# Altium integrated library Relay.IntLib: 29 symbols
Pins are listed as number, name and electrical type; pins without a type are passive.

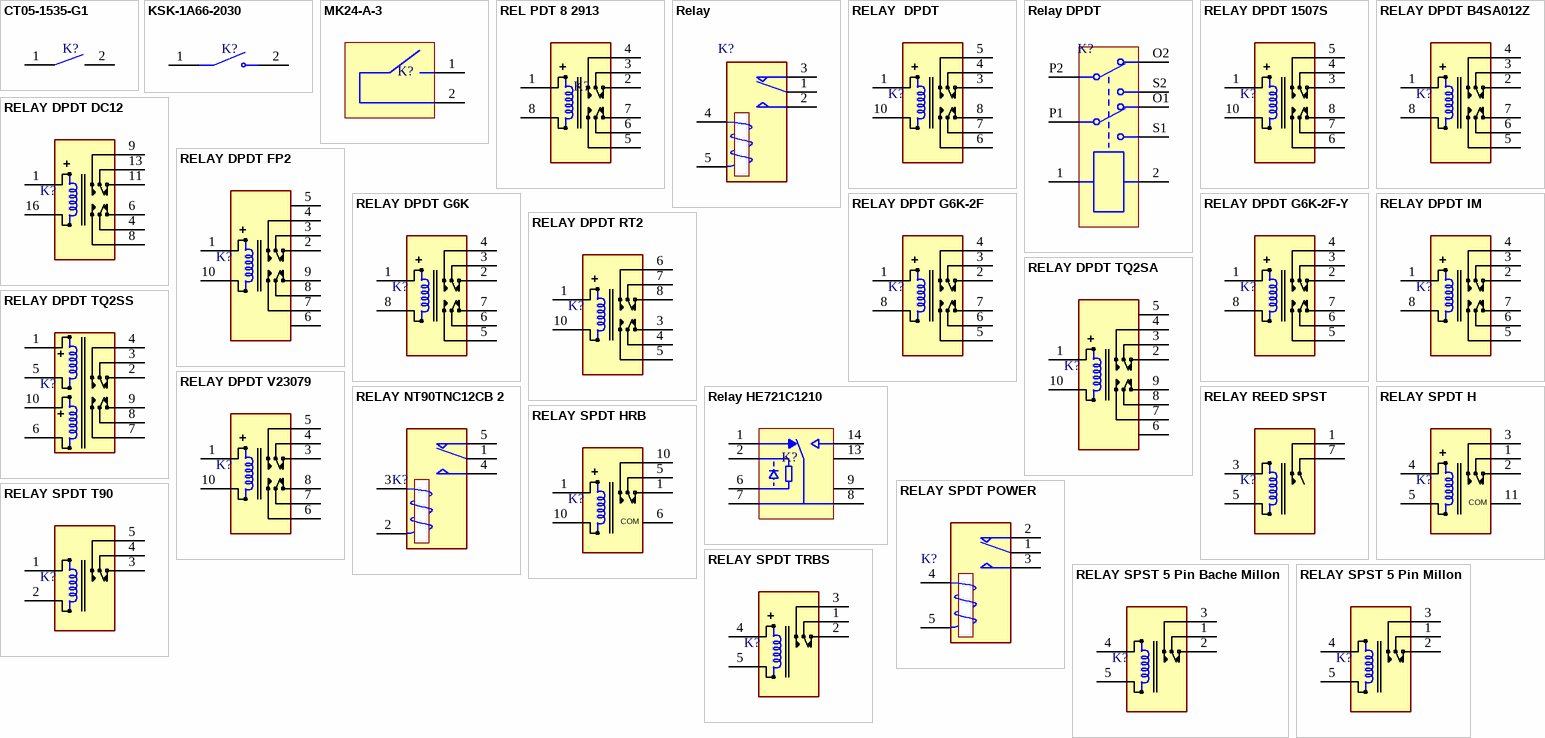
[diagram p0: symbols CT05-1535-G1 to RELAY SPST 5 Pin Millon]

## CT05-1535-G1
designator K?
Molded Body Reed Switch SPST-NO 15 ~ 35AT Operate Range 5W 250mA (AC), 350mA (DC) 100V Surface Mount; DatasheetVersion: 2022
footprint SW_CT05-1535-G1
pins: 1, 2

## KSK-1A66-2030
designator K?
Glass Body Reed Switch SPST-NO 20 ~ 30AT Operate Range 10W 500mA _AC/DC_ 180V Through Hole; DatasheetVersion: 2022
footprint SW_KSK-1A66-2030
footprint SW_KSK-1A66-2030 2
footprint SW_KSK-1A66-2030 3
pins: 1, 2

## MK24-A-3
designator K?
Molded Body Reed Switch SPST-NO 23 ~ 50AT Operate Range 1W 100mA _AC/DC_ 30V Surface Mount; DatasheetVersion: 2022
footprint SENSOR_MK24-A-3
pins: 1, 2

## REL PDT 8 2913
designator K?
DatasheetVersion: 2022
footprint REL_DPDT_8_2913 (RELAY, DPDT, 8P, 2.54mm pitch, 29X13mm, G2R-2C)
pins: 1 T1, 2 NC1, 3 COM1, 4 NO1, 5 NO2, 6 COM2, 7 NC1, 8 T2

## Relay
designator K?
SPDT Relay; DatasheetVersion: 2022; ComponentLinkp-URL: https://www.smartw.ir/
footprint TR5V L-S-Z
pins: 1 COM, 2 NO, 3 NC, 4 T1, 5 T2

## RELAY  DPDT
designator K?
Relay; ComponentLinkp-URL: https://www.smartw.ir/; DatasheetVersion: 2022
footprint REL_DPDT_8_1507 (RELAY, DPDT, 8P, 2.54mm pitch, 15X7.5mm, TE FX2, G6S-2)
pins: 1 T1, 3 NC1, 4 COM1, 5 NO1, 6 NO2, 7 COM2, 8 NC1, 10 T2

## Relay DPDT
designator K?
Dual-Pole Dual-Throw Relay; ComponentLinkp-URL: https://www.smartw.ir/; DatasheetVersion: 2022
footprint My_REL_cochick
pins: 1, 2, O1, O2, P1, P2, S1, S2

## RELAY DPDT 1507S
designator K?
Relay; ComponentLinkp-URL: https://www.smartw.ir/; DatasheetVersion: 2022
footprint REL_DPDT_8_1507S (RELAY, DPDT SMD, 8P, 2.54mm pitch, 15X7.5X9.6mm)
pins: 1 T1, 3 NC1, 4 COM1, 5 NO1, 6 NO2, 7 COM2, 8 NC1, 10 T2

## RELAY DPDT B4SA012Z
designator K?
Relay; DatasheetVersion: 2022; ComponentLinkp-URL: https://www.smartw.ir/
footprint REL_DPDT_8_1006NS (RELAY, DPDT, 10X6mm, TE IM48DGR SMD, Not equal pitch)
pins: 1 T1, 2 NC1, 3 COM1, 4 NO1, 5 NO2, 6 COM2, 7 NC1, 8 T2

## RELAY DPDT DC12
designator K?
Relay; ComponentLinkp-URL: https://www.smartw.ir/; DatasheetVersion: 2022
footprint REL_DPDT_8_2010 (RELAY, DPDT, 8P, 20.5X10.2mm, G5V-2)
pins: 1 T1, 4 COM2, 6 NC1, 8 NO2, 9 NO1, 11 NC1, 13 COM1, 16 T2

## RELAY DPDT FP2
designator K?
Relay; ComponentLinkp-URL: https://www.smartw.ir/; DatasheetVersion: 2022
footprint REL_DPDT_10_1409 (RELAY, DPDT, 10P, 14X9mm, TE FP2)
pins: 1 T1, 2 NC1, 3 COM1, 4 NO1, 5 NO2, 6 NO2, 7 NO2, 8 COM2, 9 NC1, 10 T2

## RELAY DPDT G6K
designator K?
Relay; ComponentLinkp-URL: https://www.smartw.ir/; DatasheetVersion: 2022
footprint REL_DPDT_8_1006N (RELAY, DPDT, 10X6.5X5mm, OMRON G6K-2P-Y, Not equal pitch)
footprint REL_DPDT_8_1006E (RELAY, DPDT, 10X6.5X5mm, OMRON G6K-2P EQUAL pitch 2.54mm)
pins: 1 T1, 2 NC1, 3 COM1, 4 NO1, 5 NO2, 6 COM2, 7 NC1, 8 T2

## RELAY DPDT G6K-2F
designator K?
Relay; ComponentLinkp-URL: https://www.smartw.ir/; DatasheetVersion: 2022
footprint REL_DPDT_8_1006ES (RELAY, DPDT, 10X6mm, SMD, Equal pitch 2.54mm, G6K-2F)
pins: 1 T1, 2 NC1, 3 COM1, 4 NO1, 5 NO2, 6 COM2, 7 NC1, 8 T2

## RELAY DPDT G6K-2F-Y
designator K?
Relay; ComponentLinkp-URL: https://www.smartw.ir/; DatasheetVersion: 2022
footprint REL_DPDT_8_1006NS (RELAY, DPDT, 10X6mm, TE IM48DGR SMD, Not equal pitch)
pins: 1 T1, 2 NC1, 3 COM1, 4 NO1, 5 NO2, 6 COM2, 7 NC1, 8 T2

## RELAY DPDT IM
designator K?
Relay; ComponentLinkp-URL: https://www.smartw.ir/; DatasheetVersion: 2022
footprint REL_DPDT_8_1006NS (RELAY, DPDT, 10X6mm, TE IM48DGR SMD, Not equal pitch)
pins: 1 T1, 2 NC1, 3 COM1, 4 NO1, 5 NO2, 6 COM2, 7 NC1, 8 T2

## RELAY DPDT RT2
designator K?
Relay; ComponentLinkp-URL: https://www.smartw.ir/; DatasheetVersion: 2022
footprint REL_DPDT_8_1507 (RELAY, DPDT, 8P, 2.54mm pitch, 15X7.5mm, TE FX2, G6S-2)
pins: 1 T1, 3 NC1, 4 COM2, 5 NO2, 6 NO1, 7 COM1, 8 NC1, 10 T2

## RELAY DPDT TQ2SA
designator K?
Relay; DatasheetVersion: 2022; ComponentLinkp-URL: https://www.smartw.ir/
footprint REL_DPDT_10_1409S (RELAY, DPDT, 10P, 14X9mm, TQ2SA)
pins: 1 T1, 2 NC1, 3 COM1, 4 NO1, 5 NO2, 6 NO2, 7 NO2, 8 COM2, 9 NC1, 10 T2

## RELAY DPDT TQ2SS
designator K?
Relay; ComponentLinkp-URL: https://www.smartw.ir/; DatasheetVersion: 2022
footprint REL_DPDT_10_1409S (RELAY, DPDT, 10P, 14X9mm, TQ2SA)
pins: 1 T11, 2 NC1, 3 COM1, 4 NO1, 5 T12, 6 T22, 7 NO2, 8 COM2, 9 NC1, 10 T21

## RELAY DPDT V23079
designator K?
Relay; DatasheetVersion: 2022; ComponentLinkp-URL: https://www.smartw.ir/
footprint REL_DPDT_8_1507S (RELAY, DPDT SMD, 8P, 2.54mm pitch, 15X7.5X9.6mm)
pins: 1 T1, 3 NC1, 4 COM1, 5 NO1, 6 NO2, 7 COM2, 8 NC1, 10 T2

## Relay HE721C1210
designator K?
RELAY REED SPDT 250MA 12V; DatasheetVersion: 2022
footprint Relay HE721C1210
pins: 1, 2, 6, 7, 8, 9, 13, 14

## RELAY NT90TNC12CB 2
designator K?
Relay; ComponentLinkp-URL: https://www.smartw.ir/; DatasheetVersion: 2022
footprint RELAY NT90TNC12CB (31.7x26.7x28)
footprint RELAY NT90TNC12CB (2) (31.7x26.7x28)
pins: 1 COM, 2 T2, 3 T1, 4 NO, 5 NC

## RELAY REED SPST
designator K?
Relay; ComponentLinkp-URL: https://www.smartw.ir/; DatasheetVersion: 2022
footprint RELAY REED SPST (3) (RELAY, SPST, 19X5X7.4mm, S1A05)
footprint RELAY REED SPST (2) (RELAY, SPST, 19X5X7.4mm, S1A05)
footprint RELAY REED SPST (1) (RELAY, SPST, 19X5X7.4mm, S1A05)
pins: 1 NO, 3 T1, 5 T2, 7 COM

## RELAY SPDT H
designator K?
Relay; ComponentLinkp-URL: https://www.smartw.ir/; DatasheetVersion: 2022
footprint REL_SPDT_6_1611 (RELAY, SPDT, 15.7X11X12mm, HFD41, HK4100F, TRB)
pins: 1 COM, 2 NC, 3 NO, 4 T1, 5 T2, 11 COM

## RELAY SPDT HRB
designator K?
Relay; DatasheetVersion: 2022; ComponentLinkp-URL: https://www.smartw.ir/
footprint REL_SPDT_6_1207 (RELAY, SPDT, 6P, 2.54mm pitch, 12.5X7.5mm, G5V-1, HRB)
pins: 1 NC, 1 T1, 5 COM, 6 COM, 10 NO, 10 T2

## RELAY SPDT POWER
designator K?
Relay; ComponentLinkp-URL: https://www.smartw.ir/; DatasheetVersion: 2022
footprint Relay Needle 31.7x26.7x28
pins: 1 COM, 2 NC, 3 NO, 4 T1, 5 T2

## RELAY SPDT T90
designator K?
Relay; ComponentLinkp-URL: https://www.smartw.ir/; DatasheetVersion: 2022
footprint REL_SPDT_5_T90
pins: 1 T1, 2 T2, 3 NC, 4 COM, 5 NO

## RELAY SPDT TRBS
designator K?
Relay; ComponentLinkp-URL: https://www.smartw.ir/; DatasheetVersion: 2022
footprint REL_SPDT_5_1611 (RELAY, SPDT, 15.7X11X12mm, TRBS)
pins: 1 COM, 2 NC, 3 NO, 4 T1, 5 T2

## RELAY SPST 5 Pin Bache Millon
designator K?
Relay; ComponentLinkp-URL: https://www.smartw.ir/; DatasheetVersion: 2022
footprint REL_SPDT_5_1512 (RELAY, SPDT, 15.40x12.10x14.0mm, G8QN, SUN HOLD RAM)
pins: 1 COM, 2 NC, 3 NO, 4 T1, 5 T2

## RELAY SPST 5 Pin Millon
designator K?
Relay; ComponentLinkp-URL: https://www.smartw.ir/; DatasheetVersion: 2022
footprint REL_SPDT_5_2216 (RELAY SPDT, OMRON G5LE SERIES, 22X16mm and 18.8x15.4mm, HJR-3FF, RAS-1215)
pins: 1 COM, 2 NC, 3 NO, 4 T1, 5 T2